# Altium footprint library 19-Resistors.PcbLib: 199 footprints (part 10 of 13)
Each footprint in its own frame and in the unit in brackets; x right, y up, seen from the top. Pads: shape width x height; smd on the part's side, far side on the other; paste and mask are expansions set on the pad; w line width, h text height; cw(c..) or ccw(c..) is an arc to the next point about the centre after c.
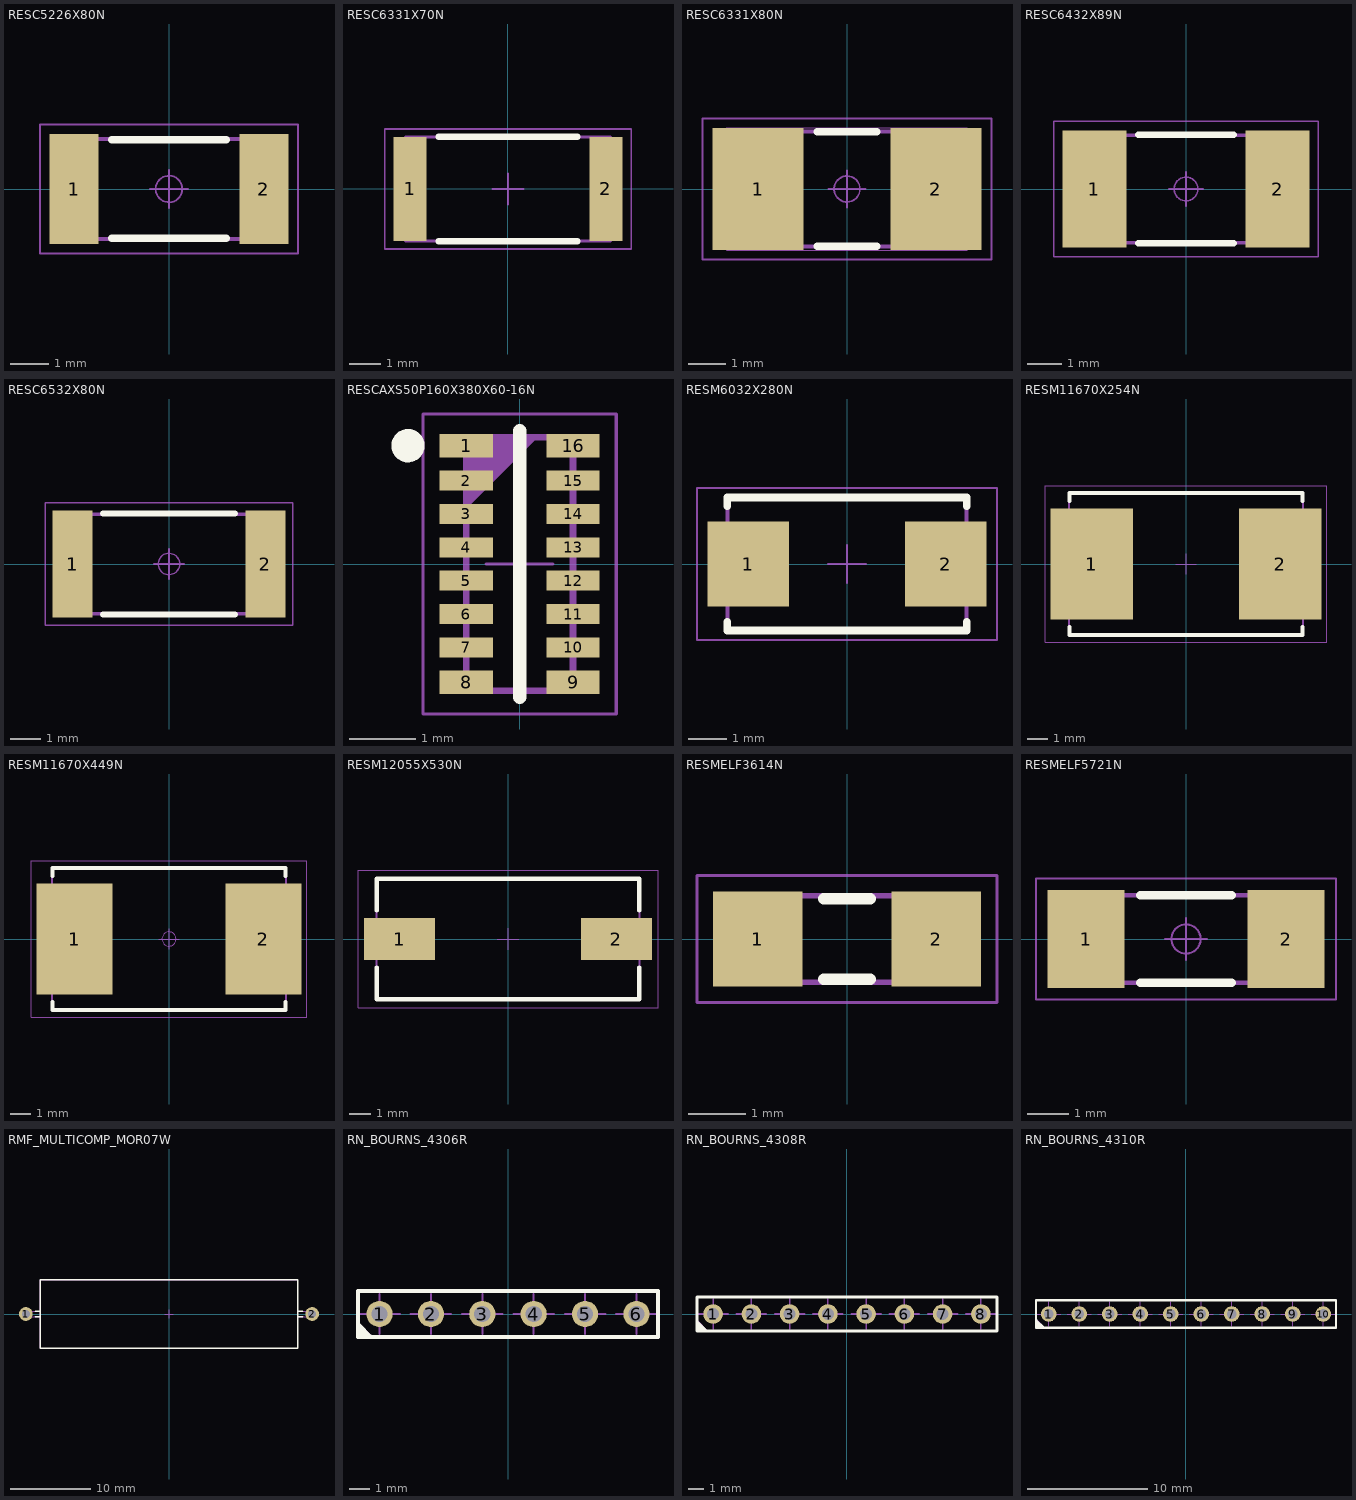
[diagram p9: the footprints below, top view; thin cyan lines are the x and y axes]

## RESC5226X80N [mm] "Resistor, Chip; 5.23mm L X 2.64mm W X 0.80mm H IPC Medium Density"
height 0.8
pads (2):
  rect 1.3x2.9 smd: 1(-2.5,0) 2(2.5,0)
Top Overlay:
  lines w0.2: -1.5,-1.3 1.5,-1.3 ; -1.5,1.3 1.5,1.3
Mechanical 14:
  lines w0.1: -2.615,-1.32 2.615,-1.32 2.615,1.32 -2.615,1.32 -2.615,-1.32
Mechanical 15:
  circle w0.05: c0,0 r0.35
  lines w0.05: -0.5,0 0.5,0 ; 0,-0.5 0,0.5 ; -3.4,-1.7 3.4,-1.7 3.4,1.7 -3.4,1.7 -3.4,-1.7
3D body "RESC5226X80N.stp": height 0.8, standoff 0, extent -2.615,-1.32 2.615,1.32
3D body "p290-130.stp": height 0.02, standoff 0, extent -3.15,-1.45 -1.85,1.45
3D body "p290-130.stp": height 0.02, standoff 0, extent 1.85,-1.45 3.15,1.45

## RESC6331X70N [mm] "Chip Resistor, EIA 2512, Metric 6331, 2-Leads, Body 6.3x3.1mm, IPC Medium Density"
height 0.7
pads (2):
  rect 1.05x3.3 smd: 1(-3.1,0) 2(3.1,0)
Top Overlay:
  lines w0.2: -2.2,-1.65 2.2,-1.65 ; -2.2,1.65 2.2,1.65
Mechanical 14:
  lines w0.1: -3.25,-1.65 -3.25,1.65 3.25,1.65 3.25,-1.65 -3.25,-1.65
Mechanical 15:
  lines w0.05: -0.5,0 0.5,0 ; 0,-0.5 0,0.5 ; -3.9,-1.9 -3.9,1.9 3.9,1.9 3.9,-1.9 -3.9,-1.9
3D body "p330-105.stp": height 0.02, standoff 0, extent -3.625,-1.65 -2.575,1.65
3D body "p330-105.stp": height 0.02, standoff 0, extent 2.575,-1.65 3.625,1.65
3D body "RESC6331X70N.stp": height 0.7, standoff 0, extent -3.25,-1.65 3.25,1.65

## RESC6331X80N [mm] "Chip Resistor, EIA 2512, Metric 6331, 2-Leads, Body 6.3x3.1mm, IPC Medium Density"
height 0.8
pads (2):
  rect 2.45x3.3 smd: 1(-2.4,0) 2(2.4,0)
Top Overlay:
  lines w0.2: -0.8,-1.55 0.8,-1.55 ; -0.8,1.55 0.8,1.55
Mechanical 14:
  lines w0.1: -3.15,-1.55 3.15,-1.55 3.15,1.55 -3.15,1.55 -3.15,-1.55
Mechanical 15:
  circle w0.05: c0,0 r0.35
  lines w0.05: -0.5,0 0.5,0 ; 0,-0.5 0,0.5 ; -3.9,-1.9 3.9,-1.9 3.9,1.9 -3.9,1.9 -3.9,-1.9
Mechanical 16:
  lines w0.001: -3.25,-1.65 3.25,-1.65 3.25,1.65 -3.25,1.65 -3.25,-1.65
3D body "RESC6331X80N.stp": height 0.8, standoff 0, extent -3.25,-1.65 3.25,1.65
3D body "p330-245.stp": height 0.02, standoff 0, extent 1.175,-1.65 3.625,1.65
3D body "p330-245.stp": height 0.02, standoff 0, extent -3.625,-1.65 -1.175,1.65

## RESC6432X89N [mm] "Resistor, Chip; 6.35mm L X 3.18mm W X 0.889mm H, IPC Medium Density"
height 0.89
pads (2):
  rect 1.9x3.45 smd: 1(-2.7,0) 2(2.7,0)
Top Overlay:
  lines w0.2: -1.4,-1.6 1.4,-1.6 ; -1.4,1.6 1.4,1.6
Mechanical 14:
  lines w0.1: -3.175,-1.59 3.175,-1.59 3.175,1.59 -3.175,1.59 -3.175,-1.59
Mechanical 15:
  circle w0.05: c0,0 r0.35
  lines w0.05: -0.5,0 0.5,0 ; 0,-0.5 0,0.5 ; -3.9,-2 3.9,-2 3.9,2 -3.9,2 -3.9,-2
3D body "p345-190.stp": height 0.02, standoff 0, extent -3.65,-1.725 -1.75,1.725
3D body "p345-190.stp": height 0.02, standoff 0, extent 1.75,-1.725 3.65,1.725
3D body "RESC6432X89N.stp": height 0.89, standoff 0, extent -3.3,-1.715 3.3,1.715

## RESC6532X80N [mm] "Resistor, Chip; 6.5mm L X 3.25mm W X 0.80mm H, IPC Medium Density"
height 0.8
pads (2):
  rect 1.3x3.5 smd: 1(-3.15,0) 2(3.15,0)
Top Overlay:
  lines w0.2: -2.15,-1.65 2.15,-1.65 ; -2.15,1.65 2.15,1.65
Mechanical 14:
  lines w0.1: -3.25,-1.625 -3.25,1.625 3.25,1.625 3.25,-1.625 -3.25,-1.625
Mechanical 15:
  circle w0.05: c0,0 r0.35
  lines w0.05: -0.5,0 0.5,0 ; 0,-0.5 0,0.5 ; -4.05,-2 -4.05,2 4.05,2 4.05,-2 -4.05,-2
3D body "p350-130.stp": height 0.02, standoff 0, extent -3.8,-1.75 -2.5,1.75
3D body "p350-130.stp": height 0.02, standoff 0, extent 2.5,-1.75 3.8,1.75
3D body "RESC6532X80N.stp": height 0.8, standoff 0, extent -3.25,-1.625 3.25,1.625

## RESCAXS50P160X380X60-16N [mm] "Resistor, Chip Array, 0.50mm pitch; 16 pin, 1.60mm W X 3.80mm L X 0.60mm H, IPC Medium Density"
height 0.6
pads (16):
  rect 0.8x0.35 smd: 1(-0.8,1.775) 8(-0.8,-1.775) 9(0.8,-1.775) 16(0.8,1.775)
  rect 0.8x0.3 smd: 2(-0.8,1.25) 3(-0.8,0.75) 4(-0.8,0.25) 5(-0.8,-0.25) 6(-0.8,-0.75) 7(-0.8,-1.25) 10(0.8,-1.25) 11(0.8,-0.75) 12(0.8,-0.25) 13(0.8,0.25) 14(0.8,0.75) 15(0.8,1.25)
Top Overlay:
  circle w0.25: c-1.675,1.775 r0.125
  lines w0.2: 0,-2 0,2
Mechanical 14:
  lines w0.1: -0.8,-1.9 0.8,-1.9 0.8,1.9 -0.8,1.9 -0.8,-1.9 ; -0.8,0.9 0.2,1.9 -0.8,0.9 ; -0.8,1 0.1,1.9 -0.8,1 ; -0.8,1.1 0,1.9 -0.8,1.1 ; -0.8,1.2 -0.1,1.9 -0.8,1.2 ; -0.8,1.3 -0.2,1.9 -0.8,1.3 ; -0.8,1.4 -0.3,1.9 -0.8,1.4 ; -0.8,1.5 -0.4,1.9 -0.8,1.5 ; -0.8,1.6 -0.5,1.9 -0.8,1.6 ; -0.8,1.7 -0.6,1.9 -0.8,1.7 ; -0.8,1.8 -0.7,1.9 -0.8,1.8
Mechanical 15:
  lines w0.05: -0.5,0 0.5,0 ; 0,-0.5 0,0.5 ; -1.45,-2.25 1.45,-2.25 1.45,2.25 -1.45,2.25 -1.45,-2.25
3D body "RESCAXS50P160X380X60-16N.stp": height 0.6, standoff 0, extent -0.9,-2 0.9,2
3D body "p080-030.stp": height 0.02, standoff 0, extent 0.4,-1.95 1.2,-1.6
3D body "p080-030.stp": height 0.02, standoff 0, extent 0.4,-1.425 1.2,-1.075
3D body "p080-030.stp": height 0.02, standoff 0, extent 0.4,-0.925 1.2,-0.575
3D body "p080-030.stp": height 0.02, standoff 0, extent 0.4,-0.425 1.2,-0.075
3D body "p080-030.stp": height 0.02, standoff 0, extent 0.4,0.075 1.2,0.425
3D body "p080-030.stp": height 0.02, standoff 0, extent 0.4,0.575 1.2,0.925
3D body "p080-030.stp": height 0.02, standoff 0, extent 0.4,1.075 1.2,1.425
3D body "p080-030.stp": height 0.02, standoff 0, extent 0.4,1.6 1.2,1.95
3D body "p080-030.stp": height 0.02, standoff 0, extent -1.2,1.6 -0.4,1.95
3D body "p080-030.stp": height 0.02, standoff 0, extent -1.2,1.075 -0.4,1.425
3D body "p080-030.stp": height 0.02, standoff 0, extent -1.2,0.575 -0.4,0.925
3D body "p080-030.stp": height 0.02, standoff 0, extent -1.2,0.075 -0.4,0.425
3D body "p080-030.stp": height 0.02, standoff 0, extent -1.2,-0.425 -0.4,-0.075
3D body "p080-030.stp": height 0.02, standoff 0, extent -1.2,-0.925 -0.4,-0.575
3D body "p080-030.stp": height 0.02, standoff 0, extent -1.2,-1.425 -0.4,-1.075
3D body "p080-030.stp": height 0.02, standoff 0, extent -1.2,-1.95 -0.4,-1.6

## RESM6032X280N [mm] "Molded Chip Resistor, 2-Leads, Body 6x3.2mm, IPC Medium Density"
height 2.8
pads (2):
  rect 2.15x2.25 smd: 1(-2.6,0) 2(2.6,0)
Top Overlay:
  lines w0.2: -3.15,-1.525 -3.15,-1.75 3.15,-1.75 3.15,-1.525 ; -3.15,1.525 -3.15,1.75 3.15,1.75 3.15,1.525
Mechanical 14:
  lines w0.1: -3.15,-1.75 -3.15,1.75 3.15,1.75 3.15,-1.75 -3.15,-1.75
Mechanical 15:
  lines w0.05: -0.5,0 0.5,0 ; 0,-0.5 0,0.5 ; -3.95,-2 -3.95,2 3.95,2 3.95,-2 -3.95,-2
3D body "RESM6032X280N.stp": height 2.8, standoff 0, extent -3.15,-1.75 3.15,1.75
3D body "p225-215.stp": height 0.02, standoff 0, extent -3.675,-1.125 -1.525,1.125
3D body "p225-215.stp": height 0.02, standoff 0, extent 1.525,-1.125 3.675,1.125

## RESM11670X254N [mm] "Resistor, Molded Body; 11.56mm L X 6.98mm W X 2.537mm H, IPC Medium Density"
height 2.54
pads (2):
  rect 4.05x5.5 smd: 1(-4.65,0) 2(4.65,0)
Top Overlay:
  lines w0.2: -5.75,-3.1 -5.75,-3.5 5.75,-3.5 5.75,-3.1 ; -5.75,3.1 -5.75,3.5 5.75,3.5 5.75,3.1
Mechanical 14:
  lines w0.1: -5.78,-3.49 5.78,-3.49 5.78,3.49 -5.78,3.49 -5.78,-3.49
Mechanical 15:
  lines w0.05: -0.5,0 0.5,0 ; 0,-0.5 0,0.5 ; -6.95,-3.85 6.95,-3.85 6.95,3.85 -6.95,3.85 -6.95,-3.85
3D body "RESM11670X254N.stp": height 2.54, standoff 0, extent -6.186,-3.553 6.187,3.554
3D body "p550-405.stp": height 0.02, standoff 0, extent -6.675,-2.75 -2.625,2.75
3D body "p550-405.stp": height 0.02, standoff 0, extent 2.625,-2.75 6.675,2.75

## RESM11670X449N [mm] "Resistor, Molded Body; 11.56mm L X 6.98mm W X 4.49mm H, IPC Medium Density"
height 4.49
pads (2):
  rect 3.75x5.5 smd: 1(-4.65,0) 2(4.65,0)
Top Overlay:
  lines w0.2: -5.75,-3.1 -5.75,-3.5 5.75,-3.5 5.75,-3.1 ; -5.75,3.1 -5.75,3.5 5.75,3.5 5.75,3.1
Mechanical 14:
  lines w0.1: -5.78,-3.49 5.78,-3.49 5.78,3.49 -5.78,3.49 -5.78,-3.49
Mechanical 15:
  circle w0.05: c0,0 r0.35
  lines w0.05: -0.5,0 0.5,0 ; 0,-0.5 0,0.5 ; -6.8,-3.85 6.8,-3.85 6.8,3.85 -6.8,3.85 -6.8,-3.85
3D body "RESM11670X449N.stp": height 4.49, standoff 0, extent -6.186,-3.553 6.187,3.554
3D body "p550-375.stp": height 0.02, standoff 0, extent -6.525,-2.725 -2.775,2.775
3D body "p550-375.stp": height 0.02, standoff 0, extent 2.8,-2.75 6.55,2.75

## RESM12055X530N [mm] "Resistor, Molded Body; 12mm L X 5.5mm W X 5.3mm H, IPC Medium Density"
height 5.3
pads (2):
  rect 3.25x1.9 smd: 1(-4.95,0) 2(4.95,0)
Top Overlay:
  lines w0.2: -6,-1.3 -6,-2.75 6,-2.75 6,-1.3 ; -6,1.3 -6,2.75 6,2.75 6,1.3
Mechanical 14:
  lines w0.1: -6,-2.75 6,-2.75 6,2.75 -6,2.75 -6,-2.75
Mechanical 15:
  lines w0.05: -0.5,0 0.5,0 ; 0,-0.5 0,0.5 ; -6.85,-3.15 6.85,-3.15 6.85,3.15 -6.85,3.15 -6.85,-3.15
3D body "RESM12055X530N.stp": height 5, standoff 0, extent -6,-2.9 6,2.9
3D body "p325-190.stp": height 0.02, standoff 0, extent -6.575,-0.95 -3.325,0.95
3D body "p325-190.stp": height 0.02, standoff 0, extent 3.325,-0.95 6.575,0.95

## RESMELF3614N [mm] "MELF Resistor, 2-Leads, Body 3.6x1.4mm, IPC Medium Density"
height 1.5
pads (2):
  rect 1.55x1.65 smd: 1(-1.55,0) 2(1.55,0)
Top Overlay:
  lines w0.2: -0.4,-0.7 0.4,-0.7 ; -0.4,0.7 0.4,0.7
Mechanical 14:
  lines w0.1: -1.9,-0.75 -1.9,0.75 1.9,0.75 1.9,-0.75 -1.9,-0.75
Mechanical 15:
  lines w0.05: -2.6,-1.1 -2.6,1.1 2.6,1.1 2.6,-1.1 -2.6,-1.1
3D body "RESMELF3614N.stp": height 1.5, standoff 0, extent -1.9,-0.75 1.9,0.75
3D body "p165-155.stp": height 0.02, standoff 0, extent 0.775,-0.825 2.325,0.825
3D body "p165-155.stp": height 0.02, standoff 0, extent -2.325,-0.825 -0.775,0.825

## RESMELF5721N [mm] "MELF Resistor, 2-Leads, Body 5.7x2.1mm, IPC Medium Density"
height 2.2
pads (2):
  rect 1.85x2.35 smd: 1(-2.4,0) 2(2.4,0)
Top Overlay:
  lines w0.2: -1.1,-1.05 1.1,-1.05 ; -1.1,1.05 1.1,1.05
Mechanical 14:
  lines w0.1: -2.85,-1.05 2.85,-1.05 2.85,1.05 -2.85,1.05 -2.85,-1.05
Mechanical 15:
  circle w0.05: c0,0 r0.35
  lines w0.05: -0.5,0 0.5,0 ; 0,-0.5 0,0.5 ; -3.6,-1.45 3.6,-1.45 3.6,1.45 -3.6,1.45 -3.6,-1.45
3D body "RESMELF5822N.stp": height 2.3, standoff 0.1, extent -2.9,-1.1 2.9,1.1
3D body "p235-185.stp": height 0.02, standoff 0, extent -3.325,-1.175 -1.475,1.175
3D body "p235-185.stp": height 0.02, standoff 0, extent 1.475,-1.175 3.325,1.175

## RMF_MULTICOMP_MOR07W [mm] "Resistor, Axial, Leads Spacing 35.56mm, Lead Dia. 0.7, Body Lengh 32mm, Diameter 8.5mm"
height 8.5
pads (2):
  round 1.7 hole 1: 1(-17.78,0) 2(17.78,0)
Top Overlay:
  lines w0.2: -16.58,-0.35 -16,-0.35 ; -16.58,0.35 -16,0.35 ; 16,-0.35 16.58,-0.35 ; 16,0.35 16.58,0.35 ; -16,-4.25 16,-4.25 16,4.25 -16,4.25 -16,-4.25
Mechanical 8:
  lines w0.1: -18.28,0 -17.78,0 ; -17.78,-0.5 -17.78,0 ; -17.78,0.5 -17.78,0 ; -17.28,0 -17.78,0 ; -0.5,0 0,0 ; 0,-0.5 0,0 ; 0,0.5 0,0 ; 0.5,0 0,0 ; 17.28,0 17.78,0 ; 17.78,-0.5 17.78,0 ; 17.78,0.5 17.78,0 ; 18.28,0 17.78,0
Mechanical 14:
  lines w0.1: -16,-0.35 -17.78,-0.35 cw(c-17.78,0) -17.78,0.35 -16,0.35 ; 16,-0.35 17.78,-0.35 ccw(c17.78,0) 17.78,0.35 16,0.35 ; -16,-4.25 16,-4.25 16,4.25 -16,4.25 -16,-4.25
3D body "v200-130.stp": height 0.02, standoff -1.65, extent 16.78,-1 18.78,1
3D body "v200-130.stp": height 0.02, standoff -1.65, extent -18.78,-1 -16.78,1
3D body "RMF_MULTICOMP_MOR07W.stp": height 8.5, standoff -3.8, extent -18.13,-4.25 18.13,4.25

## RN_BOURNS_4306R [mm] "SIP-6 Resistor Network, Body 14.83 x 2.16mm, Bourns Serie 4300R"
height 4.95
pads (6):
  round 1.3 hole 0.8: 1(-6.35,0) 2(-3.81,0) 3(-1.27,0) 4(1.27,0) 5(3.81,0) 6(6.35,0)
Top Overlay:
  lines w0.2: -7.4,-0.975 -7.25,-1.125 ; -7.4,-0.825 -7.1,-1.125 ; -7.4,-0.7 -6.975,-1.125 ; -7.4,-0.525 -6.8,-1.125 ; -7.415,-1.13 7.415,-1.13 7.415,1.13 -7.415,1.13 -7.415,-1.13
Mechanical 8:
  lines w0.1: -7.35,0 -6.35,0 ; -6.35,-1 -6.35,0 ; -6.35,1 -6.35,0 ; -5.35,0 -6.35,0 ; -4.81,0 -3.81,0 ; -3.81,-1 -3.81,0 ; -3.81,1 -3.81,0 ; -2.81,0 -3.81,0 ; -2.27,0 -1.27,0 ; -1.27,-1 -1.27,0 ; -1.27,1 -1.27,0 ; -0.27,0 -1.27,0 ; 0.27,0 1.27,0 ; 1.27,-1 1.27,0 ; 1.27,1 1.27,0 ; 2.27,0 1.27,0 ; 2.81,0 3.81,0 ; 3.81,-1 3.81,0 ; 3.81,1 3.81,0 ; 4.81,0 3.81,0 ; 5.35,0 6.35,0 ; 6.35,-1 6.35,0 ; 6.35,1 6.35,0 ; 7.35,0 6.35,0
Mechanical 14:
  lines w0.1: -7.4,-1.05 -7.325,-1.125 ; -7.4,-0.95 -7.225,-1.125 ; -7.4,-0.875 -7.15,-1.125 ; -7.4,-0.8 -7.075,-1.125 ; -7.4,-0.725 -7,-1.125 ; -7.4,-0.65 -6.925,-1.125 ; -7.4,-0.575 -6.85,-1.125 ; -7.4,-0.45 -6.725,-1.125 ; -7.415,-1.13 7.415,-1.13 7.415,1.13 -7.415,1.13 -7.415,-1.13
3D body "v200-130.stp": height 0.02, standoff -1.65, extent 5.35,-1 7.35,1
3D body "v200-130.stp": height 0.02, standoff -1.65, extent 2.81,-1 4.81,1
3D body "v200-130.stp": height 0.02, standoff -1.65, extent 0.27,-1 2.27,1
3D body "v200-130.stp": height 0.02, standoff -1.65, extent -2.27,-1 -0.27,1
3D body "v200-130.stp": height 0.02, standoff -1.65, extent -4.81,-1 -2.81,1
3D body "v200-130.stp": height 0.02, standoff -1.65, extent -7.35,-1 -5.35,1
3D body "RN_BOURNS_4306R.stp": height 4.95, standoff -3.79, extent -7.415,-1.13 7.415,1.13

## RN_BOURNS_4308R [mm] "SIP-8 Resistor Network, Body 19.92x 2.16mm, Bourns Serie 4300R"
height 4.95
pads (8):
  round 1.3 hole 0.8: 1(-8.89,0) 2(-6.35,0) 3(-3.81,0) 4(-1.27,0) 5(1.27,0) 6(3.81,0) 7(6.35,0) 8(8.89,0)
Top Overlay:
  lines w0.2: -9.94,-0.975 -9.79,-1.125 ; -9.94,-0.825 -9.64,-1.125 ; -9.94,-0.7 -9.515,-1.125 ; -9.94,-0.525 -9.34,-1.125 ; -9.955,-1.13 9.955,-1.13 9.955,1.13 -9.955,1.13 -9.955,-1.13
Mechanical 8:
  lines w0.1: -9.89,0 -8.89,0 ; -8.89,-1 -8.89,0 ; -8.89,1 -8.89,0 ; -7.89,0 -8.89,0 ; -7.35,0 -6.35,0 ; -6.35,-1 -6.35,0 ; -6.35,1 -6.35,0 ; -5.35,0 -6.35,0 ; -4.81,0 -3.81,0 ; -3.81,-1 -3.81,0 ; -3.81,1 -3.81,0 ; -2.81,0 -3.81,0 ; -2.27,0 -1.27,0 ; -1.27,-1 -1.27,0 ; -1.27,1 -1.27,0 ; -0.27,0 -1.27,0 ; 0.27,0 1.27,0 ; 1.27,-1 1.27,0 ; 1.27,1 1.27,0 ; 2.27,0 1.27,0 ; 2.81,0 3.81,0 ; 3.81,-1 3.81,0 ; 3.81,1 3.81,0 ; 4.81,0 3.81,0 ; 5.35,0 6.35,0 ; 6.35,-1 6.35,0 ; 6.35,1 6.35,0 ; 7.35,0 6.35,0 ; 7.89,0 8.89,0 ; 8.89,-1 8.89,0 ; 8.89,1 8.89,0 ; 9.89,0 8.89,0
Mechanical 14:
  lines w0.1: -9.94,-1.05 -9.865,-1.125 ; -9.94,-0.95 -9.765,-1.125 ; -9.94,-0.875 -9.69,-1.125 ; -9.94,-0.8 -9.615,-1.125 ; -9.94,-0.725 -9.54,-1.125 ; -9.94,-0.65 -9.465,-1.125 ; -9.94,-0.575 -9.39,-1.125 ; -9.94,-0.45 -9.265,-1.125 ; -9.955,-1.13 9.955,-1.13 9.955,1.13 -9.955,1.13 -9.955,-1.13
3D body "v200-130.stp": height 0.02, standoff -1.65, extent 7.89,-1 9.89,1
3D body "v200-130.stp": height 0.02, standoff -1.65, extent 5.35,-1 7.35,1
3D body "v200-130.stp": height 0.02, standoff -1.65, extent 2.81,-1 4.81,1
3D body "v200-130.stp": height 0.02, standoff -1.65, extent 0.27,-1 2.27,1
3D body "v200-130.stp": height 0.02, standoff -1.65, extent -2.27,-1 -0.27,1
3D body "v200-130.stp": height 0.02, standoff -1.65, extent -4.81,-1 -2.81,1
3D body "v200-130.stp": height 0.02, standoff -1.65, extent -7.35,-1 -5.35,1
3D body "v200-130.stp": height 0.02, standoff -1.65, extent -9.89,-1 -7.89,1
3D body "RN_BOURNS_4308R.stp": height 4.95, standoff -3.79, extent -9.955,-1.13 9.955,1.13

## RN_BOURNS_4310R [mm] "SIP-10 Resistor Network, Body 24.99x 2.16mm, Bourns Serie 4300R"
height 4.95
pads (10):
  round 1.3 hole 0.8: 1(-11.43,0) 2(-8.89,0) 3(-6.35,0) 4(-3.81,0) 5(-1.27,0) 6(1.27,0) 7(3.81,0) 8(6.35,0) 9(8.89,0) 10(11.43,0)
Top Overlay:
  lines w0.2: -12.48,-0.975 -12.33,-1.125 ; -12.48,-0.825 -12.18,-1.125 ; -12.48,-0.7 -12.055,-1.125 ; -12.48,-0.525 -11.88,-1.125 ; -12.495,-1.13 12.495,-1.13 12.495,1.13 -12.495,1.13 -12.495,-1.13
Mechanical 8:
  lines w0.1: -12.43,0 -11.43,0 ; -11.43,-1 -11.43,0 ; -11.43,1 -11.43,0 ; -10.43,0 -11.43,0 ; -9.89,0 -8.89,0 ; -8.89,-1 -8.89,0 ; -8.89,1 -8.89,0 ; -7.89,0 -8.89,0 ; -7.35,0 -6.35,0 ; -6.35,-1 -6.35,0 ; -6.35,1 -6.35,0 ; -5.35,0 -6.35,0 ; -4.81,0 -3.81,0 ; -3.81,-1 -3.81,0 ; -3.81,1 -3.81,0 ; -2.81,0 -3.81,0 ; -2.27,0 -1.27,0 ; -1.27,-1 -1.27,0 ; -1.27,1 -1.27,0 ; -0.27,0 -1.27,0 ; 0.27,0 1.27,0 ; 1.27,-1 1.27,0 ; 1.27,1 1.27,0 ; 2.27,0 1.27,0 ; 2.81,0 3.81,0 ; 3.81,-1 3.81,0 ; 3.81,1 3.81,0 ; 4.81,0 3.81,0 ; 5.35,0 6.35,0 ; 6.35,-1 6.35,0 ; 6.35,1 6.35,0 ; 7.35,0 6.35,0 ; 7.89,0 8.89,0 ; 8.89,-1 8.89,0 ; 8.89,1 8.89,0 ; 9.89,0 8.89,0 ; 10.43,0 11.43,0 ; 11.43,-1 11.43,0 ; 11.43,1 11.43,0 ; 12.43,0 11.43,0
Mechanical 14:
  lines w0.1: -12.48,-1.05 -12.405,-1.125 ; -12.48,-0.95 -12.305,-1.125 ; -12.48,-0.875 -12.23,-1.125 ; -12.48,-0.8 -12.155,-1.125 ; -12.48,-0.725 -12.08,-1.125 ; -12.48,-0.65 -12.005,-1.125 ; -12.48,-0.575 -11.93,-1.125 ; -12.48,-0.45 -11.805,-1.125 ; 12.495,-1.13 12.495,1.13 ; 12.495,-1.13 -12.495,-1.13 -12.495,1.13 12.495,1.13 ; 12.495,-1.13 12.495,1.13
3D body "v200-130.stp": height 0.02, standoff -1.65, extent 10.43,-1 12.43,1
3D body "v200-130.stp": height 0.02, standoff -1.65, extent 7.89,-1 9.89,1
3D body "v200-130.stp": height 0.02, standoff -1.65, extent 5.35,-1 7.35,1
3D body "v200-130.stp": height 0.02, standoff -1.65, extent 2.81,-1 4.81,1
3D body "v200-130.stp": height 0.02, standoff -1.65, extent 0.27,-1 2.27,1
3D body "v200-130.stp": height 0.02, standoff -1.65, extent -2.27,-1 -0.27,1
3D body "v200-130.stp": height 0.02, standoff -1.65, extent -4.81,-1 -2.81,1
3D body "v200-130.stp": height 0.02, standoff -1.65, extent -7.35,-1 -5.35,1
3D body "v200-130.stp": height 0.02, standoff -1.65, extent -9.89,-1 -7.89,1
3D body "v200-130.stp": height 0.02, standoff -1.65, extent -12.43,-1 -10.43,1
3D body "RN_BOURNS_4310R.stp": height 4.95, standoff -3.79, extent -12.495,-1.13 12.495,1.13